# Altium footprint library Libraries_2014_0618.PcbLib: 391 footprints (part 3 of 25)
Each footprint in its own frame and in the unit in brackets; x right, y up, seen from the top. Pads: shape width x height; smd on the part's side, far side on the other; paste and mask are expansions set on the pad; w line width, h text height; cw(c..) or ccw(c..) is an arc to the next point about the centre after c.
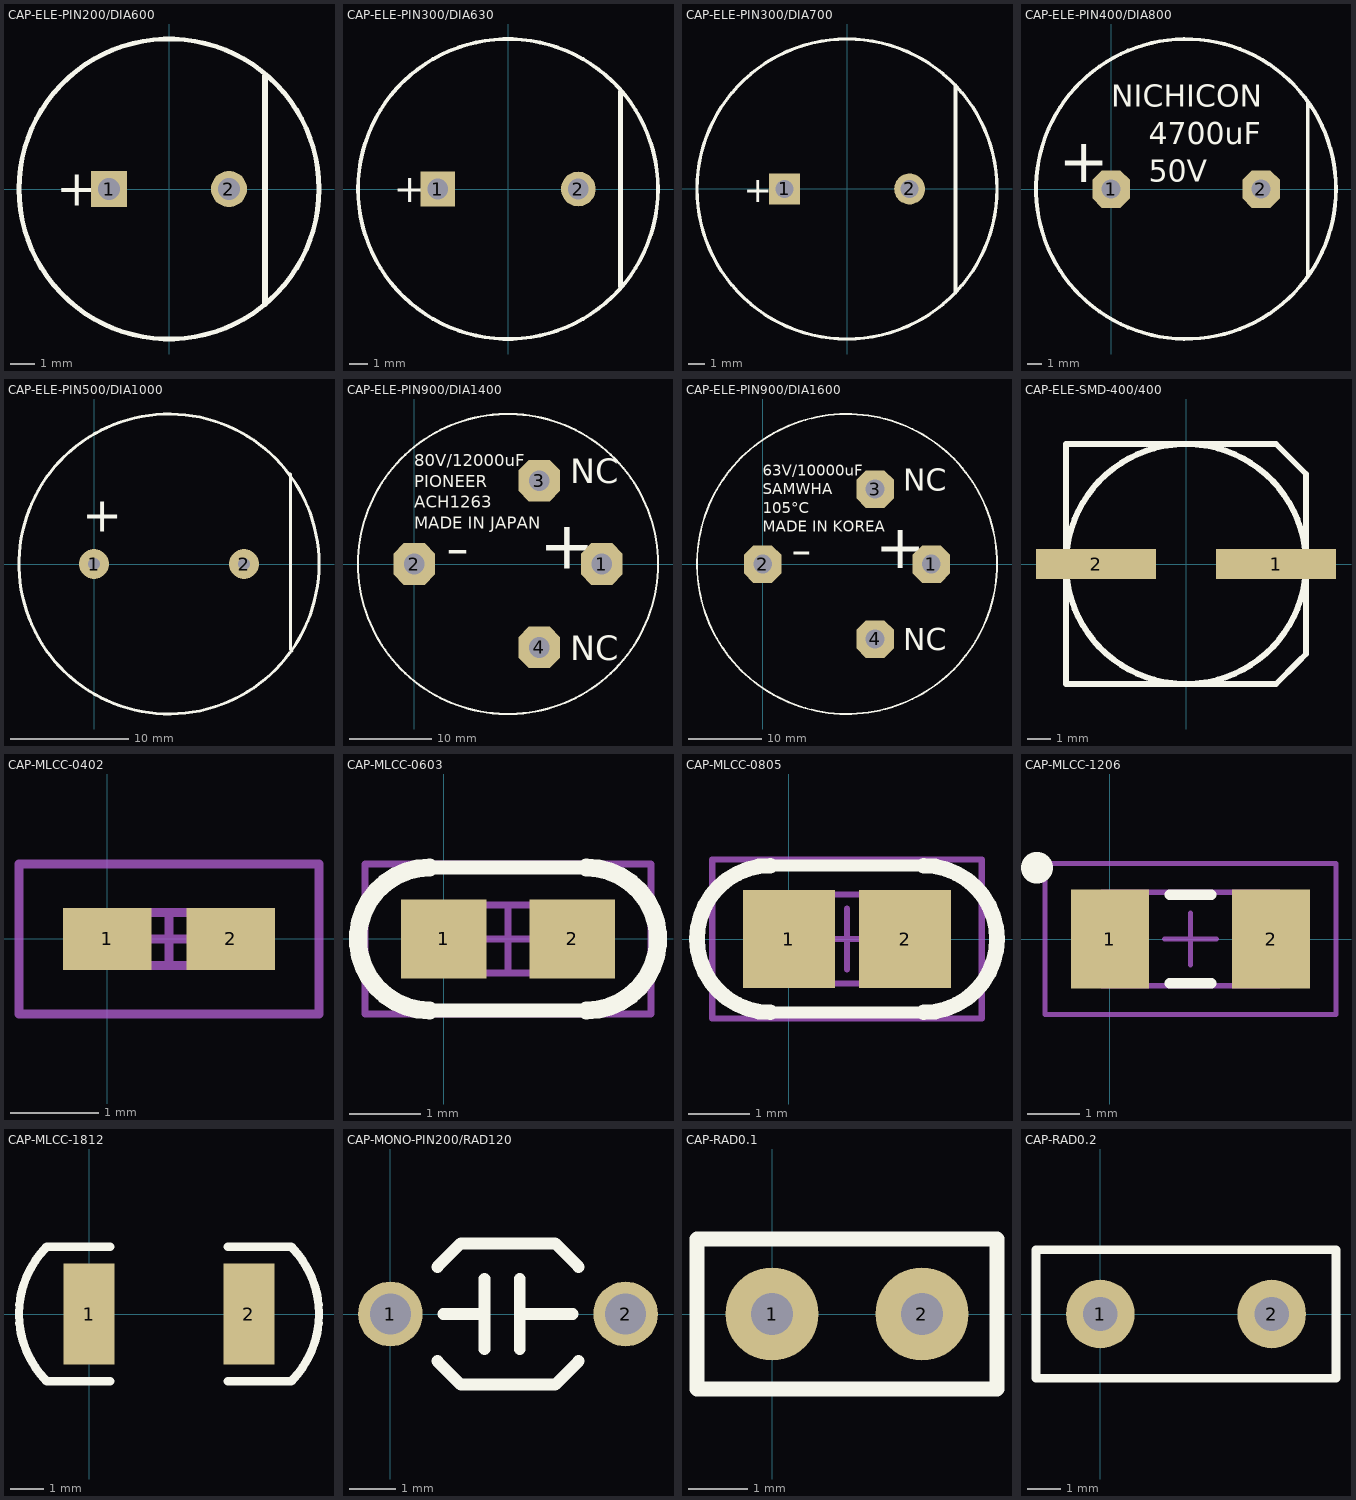
[diagram p2: the footprints below, top view; thin cyan lines are the x and y axes]

## CAP-ELE-PIN200/DIA600 [mm] "Capacitor, Electrolytic, Radial; Body 12.5 x 20 mm (Dia.xH typ); Pin Spacing 5 mm (typ)"
height 21.5
pads (2):
  rect 1.5x1.5 hole 0.9: 1(-2.5,0)
  round 1.5 hole 0.9: 2(2.5,0)
Top Overlay:
  circle w0.2: c0,0 r6.25
  lines w0.254: 4,-4.8 4,4.7
  text "+" at -4.7,-0.7 h1.5

## CAP-ELE-PIN300/DIA630 [mm] "Capacitor, Electrolytic, Radial; Body 16 x 20 mm (Dia.xH typ); Pin Spacing 7.5 mm (typ)"
height 21.5
pads (2):
  rect 1.85x1.85 hole 1.1: 1(-3.75,0)
  round 1.85 hole 1.1: 2(3.75,0)
Top Overlay:
  circle w0.2: c0,0 r8
  lines w0.254: 6,-5.2 6,5.2
  text "+" at -6.1,-0.7 h1.5

## CAP-ELE-PIN300/DIA700 [mm] "Capacitor, Electrolytic, Radial; Body 18 x 35.5 mm (Dia.xH typ); Pin Spacing 7.5 mm (typ)"
height 37.5
pads (2):
  rect 1.85x1.85 hole 1.1: 1(-3.75,0)
  round 1.85 hole 1.1: 2(3.75,0)
Top Overlay:
  circle w0.2: c-0.004,-0.001 r9
  lines w0.254: 6.5,-6.2 6.5,6.2
  text "+" at -6.2,-0.8 h1.5

## CAP-ELE-PIN400/DIA800 [mil] "NICHICON,4700UF,50V,PIN 10MM,DIA 20MM"
height 1968.5
pads (2):
  oct 100x100 hole 50: 1(0,0) 2(400,0)
Top Overlay:
  circle w10: c200,0 r400
  lines w10: 525,-235 525,230
  text "50V" at 100,0 h100
  text "4700uF" at 100,100 h100
  text "NICHICON" at 0,200 h100
  text "+" at -140,-20 h200

## CAP-ELE-PIN500/DIA1000 [mil]
height 1700
pads (2):
  round 100 hole 40: 1(0,0) 2(500,0)
Top Overlay:
  circle w10: c250,0 r500
  lines w10: 655,300 655,-285 660,-290
  text "+" at -40,70 h200

## CAP-ELE-PIN900/DIA1400 [mil]
pads (4):
  oct 200x200 hole 100: 1(900,0) 2(0,0) 3(600,400) 4(600,-400)
Top Overlay:
  circle w10: c450,0 r720
  text "80V/12000uF" at 0,450 h100
  text "MADE IN JAPAN" at 0,150 h100
  text "ACH1263" at 0,250 h100
  text "PIONEER" at 0,350 h100
  text "-" at 150,-100 h400
  text "+" at 600,-100 h400
  text "NC" at 750,-500 h200
  text "NC" at 750,350 h200

## CAP-ELE-PIN900/DIA1600 [mil]
pads (4):
  oct 200x200 hole 100: 1(900,0) 2(0,0) 3(600,400) 4(600,-400)
Top Overlay:
  circle w10: c450,0 r800
  text "NC" at 750,350 h200
  text "NC" at 750,-500 h200
  text "+" at 600,-100 h400
  text "-" at 150,-100 h400
  text "SAMWHA" at 0,350 h100
  text "MADE IN KOREA" at 0,150 h100
  text "63V/10000uF" at 0,450 h100
  text "105°C" at 0,250 h100

## CAP-ELE-SMD-400/400 [mil] "330uF/35V"
pads (2):
  rect 200x50 smd: 1(150,0) 2(-150,0)
Top Overlay:
  circle w10: c0,0 r200
  lines w10: -200,-200 150,-200 187.39,-162.61 200,-150 200,150 150,200 -200,200 -200,0 -200,-200

## CAP-MLCC-0402 [mm]
pads (2):
  rect 1x0.7 smd: 1(0,0) 2(1.4,0)
Mechanical 13:
  lines w0.1: 0.15,-0.3 1.25,-0.3 1.25,0.3 0.15,0.3 0.15,-0.3
Mechanical 15:
  lines w0.1: 0.4,0 1,0 ; 0.7,-0.3 0.7,0.3 ; -1,-0.85 2.4,-0.85 2.4,0.85 -1,0.85 -1,-0.85
3D body: height 0.6, standoff 0, extent 0.15,-0.3 1.25,0.3

## CAP-MLCC-0603 [mm]
pads (2):
  rect 1.2x1.1 smd: 1(0,0) 2(1.8,0)
Top Overlay:
  lines w0.2: -0.2,-1 2,-1 ; -0.2,1 2,1
  lines w0.254: -0.2,-1 cw(c-0.2,0) -0.2,1 ; 2,-1 ccw(c2,0) 2,1
Mechanical 13:
  lines w0.1: 0.025,-0.475 1.775,-0.475 1.775,0.475 0.025,0.475 0.025,-0.475
Mechanical 15:
  lines w0.1: 0.425,0 1.375,0 ; 0.9,-0.475 0.9,0.475 ; -1.1,-1.05 2.9,-1.05 2.9,1.05 -1.1,1.05 -1.1,-1.05
3D body: height 0.85, standoff 0, extent 0.025,-0.475 1.775,0.475

## CAP-MLCC-0805 [mm]
pads (2):
  rect 1.5x1.6 smd: 1(0,0) 2(1.9,0)
Top Overlay:
  lines w0.2: -0.3,-1.2 2.2,-1.2 ; -0.3,1.2 2.2,1.2
  lines w0.254: -0.3,-1.2 cw(c-0.3,0) -0.3,1.2 ; 2.2,-1.2 ccw(c2.2,0) 2.2,1.2
Mechanical 13:
  lines w0.1: -0.15,-0.725 -0.15,0.725 2.05,0.725 2.05,-0.725 -0.15,-0.725
Mechanical 15:
  lines w0.1: 0.45,0 1.45,0 ; 0.95,-0.5 0.95,0.5 ; -1.25,-1.3 -1.25,1.3 3.15,1.3 3.15,-1.3 -1.25,-1.3
3D body: height 1.1, standoff 0, extent -0.15,-0.725 2.05,0.725

## CAP-MLCC-1206 [mm]
pads (2):
  rect 1.5x1.9 smd: 1(0,0) 2(3.1,0)
Top Overlay:
  lines w0.2: 1.15,-0.85 1.95,-0.85 ; 1.15,0.85 1.95,0.85
  lines w0.6: -1.422,1.372 -1.397,1.372
Mechanical 13:
  lines w0.1: -0.15,-0.9 -0.15,0.9 3.25,0.9 3.25,-0.9 -0.15,-0.9
Mechanical 15:
  lines w0.1: 1.05,0 2.05,0 ; 1.55,-0.5 1.55,0.5 ; -1.25,-1.45 -1.25,1.45 4.35,1.45 4.35,-1.45 -1.25,-1.45
3D body: height 1.35, standoff 0, extent -0.15,-0.9 3.25,0.9

## CAP-MLCC-1812 [mil]
pads (2):
  rect 60x120 smd: 1(0,0) 2(190,0)
Top Overlay:
  lines w10: 25,-80 -50,-80 cw(c30,0) -50,80 25,80 ; 165,-80 240,-80 ccw(c160,0) 240,80 165,80

## CAP-MONO-PIN200/RAD120 [mil]
pads (2):
  round 55 hole 35: 1(0,0) 2(200,0)
Top Overlay:
  lines w10: 40,-40 60,-60 140,-60 160,-40 ; 40,40 60,60 140,60 160,40 ; 45,0 80,0 ; 80,-30 80,30 ; 110,-30 110,30 ; 110,0 155,0

## CAP-RAD0.1 [mil]
pads (2):
  round 62 hole 28: 1(0,0) 2(100,0)
Top Overlay:
  lines w10: -50,-50 -50,50 150,50 150,-50 -50,-50

## CAP-RAD0.2 [mil]
pads (2):
  round 80 hole 40: 1(0,0) 2(200,0)
Top Overlay:
  lines w10: -75,-75 -75,75 275,75 275,-75 -75,-75